# Altium integrated library LINGXIAO.IntLib: 15 symbols
Pins are listed as number, name and electrical type; pins without a type are passive.

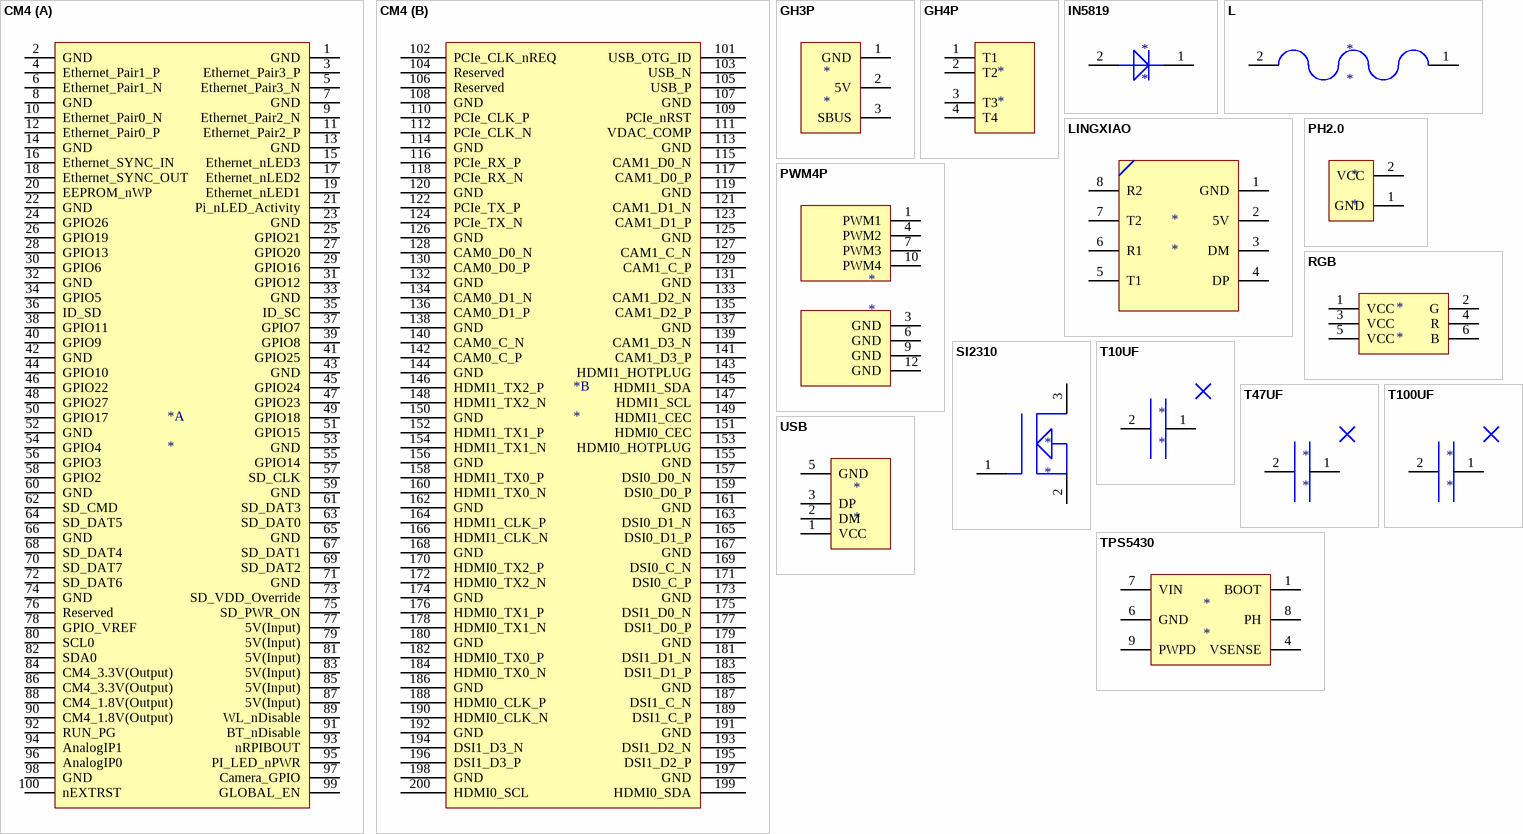
[diagram p0: symbols CM4 to USB]

## CM4
designator *
footprint CM4
part A pins: 1 GND, 2 GND, 3 Ethernet_Pair3_P, 4 Ethernet_Pair1_P, 5 Ethernet_Pair3_N, 6 Ethernet_Pair1_N, 7 GND, 8 GND, 9 Ethernet_Pair2_N, 10 Ethernet_Pair0_N, 11 Ethernet_Pair2_P, 12 Ethernet_Pair0_P, 13 GND, 14 GND, 15 Ethernet_nLED3, 16 Ethernet_SYNC_IN, 17 Ethernet_nLED2, 18 Ethernet_SYNC_OUT, 19 Ethernet_nLED1, 20 EEPROM_nWP, 21 Pi_nLED_Activity, 22 GND, 23 GND, 24 GPIO26, 25 GPIO21, 26 GPIO19, 27 GPIO20, 28 GPIO13, 29 GPIO16, 30 GPIO6, 31 GPIO12, 32 GND, 33 GND, 34 GPIO5, 35 ID_SC, 36 ID_SD, 37 GPIO7, 38 GPIO11, 39 GPIO8, 40 GPIO9, 41 GPIO25, 42 GND, 43 GND, 44 GPIO10, 45 GPIO24, 46 GPIO22, 47 GPIO23, 48 GPIO27, 49 GPIO18, 50 GPIO17, 51 GPIO15, 52 GND, 53 GND, 54 GPIO4, 55 GPIO14, 56 GPIO3, 57 SD_CLK, 58 GPIO2, 59 GND, 60 GND, 61 SD_DAT3, 62 SD_CMD, 63 SD_DAT0, 64 SD_DAT5, 65 GND, 66 GND, 67 SD_DAT1, 68 SD_DAT4, 69 SD_DAT2, 70 SD_DAT7, 71 GND, 72 SD_DAT6, 73 SD_VDD_Override, 74 GND, 75 SD_PWR_ON, 76 Reserved, 77 5V(Input), 78 GPIO_VREF, 79 5V(Input), 80 SCL0, 81 5V(Input), 82 SDA0, 83 5V(Input), 84 CM4_3.3V(Output), 85 5V(Input), 86 CM4_3.3V(Output), 87 5V(Input), 88 CM4_1.8V(Output), 89 WL_nDisable, 90 CM4_1.8V(Output), 91 BT_nDisable, 92 RUN_PG, 93 nRPIBOUT, 94 AnalogIP1, 95 PI_LED_nPWR, 96 AnalogIP0, 97 Camera_GPIO, 98 GND, 99 GLOBAL_EN, 100 nEXTRST
part B pins: 101 USB_OTG_ID, 102 PCIe_CLK_nREQ, 103 USB_N, 104 Reserved, 105 USB_P, 106 Reserved, 107 GND, 108 GND, 109 PCIe_nRST, 110 PCIe_CLK_P, 111 VDAC_COMP, 112 PCIe_CLK_N, 113 GND, 114 GND, 115 CAM1_D0_N, 116 PCIe_RX_P, 117 CAM1_D0_P, 118 PCIe_RX_N, 119 GND, 120 GND, 121 CAM1_D1_N, 122 PCIe_TX_P, 123 CAM1_D1_P, 124 PCIe_TX_N, 125 GND, 126 GND, 127 CAM1_C_N, 128 CAM0_D0_N, 129 CAM1_C_P, 130 CAM0_D0_P, 131 GND, 132 GND, 133 CAM1_D2_N, 134 CAM0_D1_N, 135 CAM1_D2_P, 136 CAM0_D1_P, 137 GND, 138 GND, 139 CAM1_D3_N, 140 CAM0_C_N, 141 CAM1_D3_P, 142 CAM0_C_P, 143 HDMI1_HOTPLUG, 144 GND, 145 HDMI1_SDA, 146 HDMI1_TX2_P, 147 HDMI1_SCL, 148 HDMI1_TX2_N, 149 HDMI1_CEC, 150 GND, 151 HDMI0_CEC, 152 HDMI1_TX1_P, 153 HDMI0_HOTPLUG, 154 HDMI1_TX1_N, 155 GND, 156 GND, 157 DSI0_D0_N, 158 HDMI1_TX0_P, 159 DSI0_D0_P, 160 HDMI1_TX0_N, 161 GND, 162 GND, 163 DSI0_D1_N, 164 HDMI1_CLK_P, 165 DSI0_D1_P, 166 HDMI1_CLK_N, 167 GND, 168 GND, 169 DSI0_C_N, 170 HDMI0_TX2_P, 171 DSI0_C_P, 172 HDMI0_TX2_N, 173 GND, 174 GND, 175 DSI1_D0_N, 176 HDMI0_TX1_P, 177 DSI1_D0_P, 178 HDMI0_TX1_N, 179 GND, 180 GND, 181 DSI1_D1_N, 182 HDMI0_TX0_P, 183 DSI1_D1_P, 184 HDMI0_TX0_N, 185 GND, 186 GND, 187 DSI1_C_N, 188 HDMI0_CLK_P, 189 DSI1_C_P, 190 HDMI0_CLK_N, 191 GND, 192 GND, 193 DSI1_D2_N, 194 DSI1_D3_N, 195 DSI1_D2_P, 196 DSI1_D3_P, 197 GND, 198 GND, 199 HDMI0_SDA, 200 HDMI0_SCL

## GH3P
designator *
footprint GH3P
pins: 1 GND, 2 5V, 3 SBUS

## GH4P
designator *
footprint GH4P
pins: 1 T1, 2 T2, 3 T3, 4 T4

## IN5819
designator *
footprint IN5819
pins: 1 T1, 2 T2

## L
designator *
footprint L
pins: 1 T3, 2 T4

## LINGXIAO
designator *
footprint LINGXIAO
pins: 1 GND, 2 5V, 3 DM, 4 DP, 5 T1, 6 R1, 7 T2, 8 R2

## PH2.0
designator *
footprint PH2.0
pins: 1 GND, 2 VCC

## PWM4P
designator *
footprint PWM4P
pins: 1 PWM1, 3 GND, 4 PWM2, 6 GND, 7 PWM3, 9 GND, 10 PWM4, 12 GND

## RGB
designator *
footprint RGB
pins: 1 VCC, 2 G, 3 VCC, 4 R, 5 VCC, 6 B

## SI2310
designator *
footprint SI2310
pins: 1 B, 2 B, 3 B

## T10UF
designator *
footprint T10UF
pins: 1 B, 2 B

## T47UF
designator *
footprint T47UF
pins: 1 B, 2 B

## T100UF
designator *
footprint T100UF
pins: 1 B, 2 B

## TPS5430
designator *
footprint TPS5430
pins: 1 BOOT, 4 VSENSE, 6 GND, 7 VIN, 8 PH, 9 PWPD

## USB
designator *
footprint USB
pins: 1 VCC, 2 DM, 3 DP, 5 GND